# Altium footprint library D-SUB.PcbLib: 8 footprints
Each footprint in its own frame and in the unit in brackets; x right, y up, seen from the top. Pads: shape width x height; smd on the part's side, far side on the other; paste and mask are expansions set on the pad; w line width, h text height; cw(c..) or ccw(c..) is an arc to the next point about the centre after c.
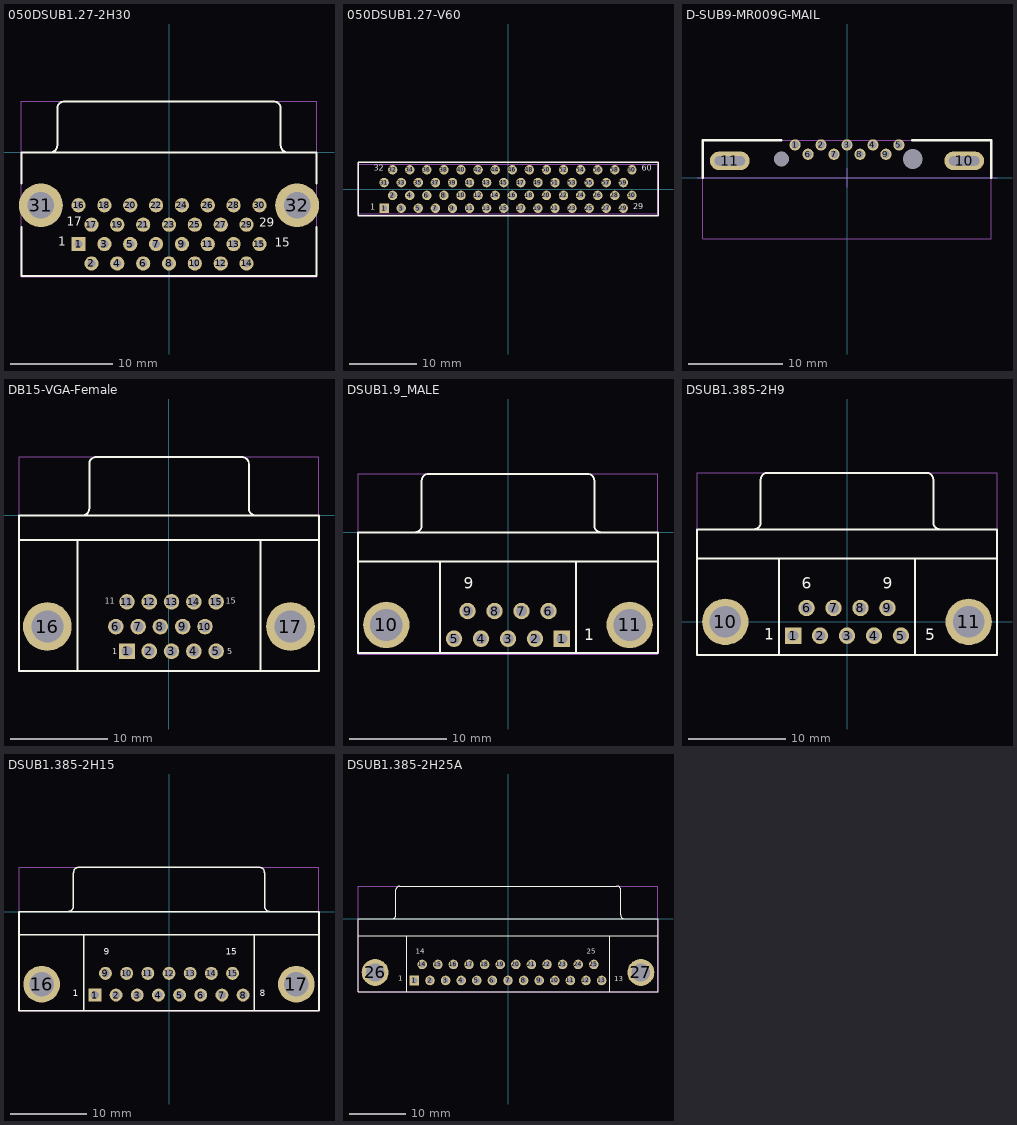
[diagram p0: the footprints below, top view; thin cyan lines are the x and y axes]

## 050DSUB1.27-2H30 [mm] "Connector; D Subminiature; 30 Position; Right Angle; Pitch 1.27 mm"
height 8.1
pads (32):
  rect 1.4x1.4 hole 0.8: 1(-8.89,-9.01)
  round 1.4 hole 0.8: 2(-7.62,-10.915) 3(-6.35,-9.01) 4(-5.08,-10.915) 5(-3.81,-9.01) 6(-2.54,-10.915) 7(-1.27,-9.01) 8(0,-10.915) 9(1.27,-9.01) 10(2.54,-10.915) 11(3.81,-9.01) 12(5.08,-10.915) 13(6.35,-9.01) 14(7.62,-10.915) 15(8.89,-9.01) 16(-8.89,-5.2) 17(-7.62,-7.105) 18(-6.35,-5.2) 19(-5.08,-7.105) 20(-3.81,-5.2) 21(-2.54,-7.105) 22(-1.27,-5.2) 23(0,-7.105) 24(1.27,-5.2) 25(2.54,-7.105) 26(3.81,-5.2) 27(5.08,-7.105) 28(6.35,-5.2) 29(7.62,-7.105) 30(8.89,-5.2)
  round 4.3 hole 2.6: 31(-12.59,-5.2) 32(12.59,-5.2)
Top Overlay:
  lines w0.2: -14.51,-7.341 -14.51,-12.17 14.51,-12.17 14.51,-7.341 ; -14.51,-3.043 -14.51,0 14.51,0 14.51,-3.043 ; -11.67,0 ccw(c-11.67,0.695) -10.975,0.695 ; -10.975,0.715 -10.975,4.305 cw(c-10.28,4.305) -10.28,5 10.28,5 cw(c10.28,4.305) 10.975,4.305 ; 10.975,4.495 10.975,0.695 ccw(c11.67,0.695) 11.67,0
  text "17" at -10.058,-7.513 h1.5
  text "29" at 8.865,-7.589 h1.5
  text "1" at -10.897,-9.494 h1.5
  text "15" at 10.389,-9.57 h1.5
Mechanical 13:
  lines w0.1: -14.51,-12.2 14.51,-12.2 14.51,5 -14.51,5 -14.51,-12.2
3D body: height 7.85, standoff -3.05, extent -14.51,-12.2 14.51,5

## 050DSUB1.27-V60 [mm] "Connector; D Subminiature; 60 Position; Vertical; Pitch 1.27 mm"
height 8
pads (60):
  rect 1.4x1.4 hole 0.8: 1(-18.415,-2.857)
  round 1.4 hole 0.8: 2(-17.145,-0.953) 3(-15.875,-2.857) 4(-14.605,-0.953) 5(-13.335,-2.857) 6(-12.065,-0.953) 7(-10.795,-2.857) 8(-9.525,-0.953) 9(-8.255,-2.857) 10(-6.985,-0.953) 11(-5.715,-2.857) 12(-4.445,-0.953) 13(-3.175,-2.857) 14(-1.905,-0.953) 15(-0.635,-2.857) 16(0.635,-0.953) 17(1.905,-2.857) 18(3.175,-0.953) 19(4.445,-2.857) 20(5.715,-0.953) 21(6.985,-2.857) 22(8.255,-0.953) 23(9.525,-2.857) 24(10.795,-0.953) 25(12.065,-2.857) 26(13.335,-0.953) 27(14.605,-2.857) 28(15.875,-0.953) 29(17.145,-2.857) 30(18.415,-0.953) 31(-18.415,0.953) 32(-17.145,2.857) 33(-15.875,0.953) 34(-14.605,2.857) 35(-13.335,0.953) 36(-12.065,2.857) 37(-10.795,0.953) 38(-9.525,2.857) 39(-8.255,0.953) 40(-6.985,2.857) 41(-5.715,0.953) 42(-4.445,2.857) 43(-3.175,0.953) 44(-1.905,2.857) 45(-0.635,0.953) 46(0.635,2.857) 47(1.905,0.953) 48(3.175,2.857) 49(4.445,0.953) 50(5.715,2.857) 51(6.985,0.953) 52(8.255,2.857) 53(9.525,0.953) 54(10.795,2.857) 55(12.065,0.953) 56(13.335,2.857) 57(14.605,0.953) 58(15.875,2.857) 59(17.145,0.953) 60(18.415,2.857)
Top Overlay:
  lines w0.2: -22.3,-4 -22.3,4 22.3,4 22.3,-4 -22.3,-4
  text "1" at -20.472,-3.353 h1.5
  text "29" at 18.593,-3.327 h1.5
  text "32" at -19.939,2.438 h1.5
  text "60" at 19.914,2.388 h1.5
Mechanical 13:
  lines w0.1: -22.3,-3.65 22.3,-3.65 22.3,3.65 -22.3,3.65 -22.3,-3.65
3D body: height 7.75, standoff -3.05, extent -22.3,-3.65 22.3,3.655

## D-SUB9-MR009G-MAIL [mm] "超薄D-SUB9 MAIL 针座"
height 11
pads (13):
  round 1.2 hole 0.8: 1(-5.54,3.5) 2(-2.77,3.5) 3(0,3.5) 4(2.77,3.5) 5(5.54,3.5) 6(-4.155,2.5) 7(-1.385,2.5) 8(1.385,2.5) 9(4.155,2.5)
  oval 4.25x2 hole 1 slot 3.25 at 0 deg: 10(12.5,1.8) 11(-12.5,1.8)
  round 1.55 hole 1.6: hole(-7,2)
  round 1.55 hole 2.1: hole(7,2)
Top Overlay:
  lines w0.25: -15.4,0 -15.4,4 -7,4 ; 6.97,4 15.4,4 15.4,0
Mechanical 1:
  lines w0.1: -16,0 16,0
Mechanical 13:
  lines w0.1: -15.4,-6.508 -15.4,4 15.4,4 15.4,-6.508 -15.4,-6.508
Mechanical 15:
  lines w0.1: -1,0 1,0 ; 0,-1 0,1
3D body: height 10.55, standoff -2.7, extent -15.4,-6.508 15.4,4

## DB15-VGA-Female [mm] "High density D sub 15 pin Female connector"
height 1
pads (17):
  rect 1.6x1.6 hole 1.1: 1(-4.31,-13.97)
  round 1.6 hole 1.1: 2(-2.02,-13.97) 3(0.27,-13.97) 4(2.56,-13.97) 5(4.85,-13.97) 6(-5.45,-11.43) 7(-3.16,-11.43) 8(-0.87,-11.43) 9(1.42,-11.43) 10(3.71,-11.43) 11(-4.31,-8.89) 12(-2.02,-8.89) 13(0.27,-8.89) 14(2.56,-8.89) 15(4.85,-8.89)
  round 5 hole 3.3: 16(-12.495,-11.43) 17(12.495,-11.43)
Top Overlay:
  lines w0.2: -15.41,-2.54 15.43,-2.54 ; -9.4,-16 -9.4,-2.54 ; -8.88,0.005 ccw(c-8.88,0.7) -8.185,0.7 -8.185,5.305 cw(c-7.49,5.305) -7.49,6 7.52,6 cw(c7.52,5.305) 8.215,5.305 ; 8.215,0.7 8.215,5.305 ; 8.215,0.7 ccw(c8.91,0.7) 8.91,0.005 ; 9.4,-16 9.4,-2.54 ; -15.41,-16 -15.41,0 15.43,0 15.43,-16 -15.41,-16
  text "11" at -6.596,-9.271 h1
  text "5" at 5.977,-14.478 h1
  text "15" at 5.85,-9.271 h1
  text "1" at -5.834,-14.478 h1
Mechanical 13:
  lines w0.05: -15.4,-16 15.4,-16 15.4,6 -15.4,6 -15.4,-16
3D body: height 12.55, standoff -3.45, extent -15.4,-16 15.4,6

## DSUB1.9_MALE [mm]
height 1
pads (11):
  rect 1.69x1.69 hole 1.1: 1(5.54,-10.92)
  round 1.69 hole 1.1: 2(2.77,-10.92) 3(0,-10.92) 4(-2.77,-10.92) 5(-5.54,-10.92) 6(4.155,-8.08) 7(1.385,-8.08) 8(-1.385,-8.08) 9(-4.155,-8.08)
  round 4.76 hole 3.3: 10(-12.495,-9.5) 11(12.495,-9.5)
Top Overlay:
  lines w0.2: -15.4,-3 15.4,-3 ; -9.56,0.005 ccw(c-9.56,0.7) -8.865,0.7 -8.865,5.305 ; -8.86,5.305 cw(c-8.165,5.305) -8.165,6 8.165,6 cw(c8.165,5.305) 8.86,5.305 ; -7,-12.4 -7,-3 ; 7,-12.4 7,-3 ; 8.865,5.305 8.865,0.7 ccw(c9.56,0.7) 9.56,0.005 ; -15.4,-12.4 -15.4,0 15.4,0 15.4,-12.4 -15.4,-12.4
  text "1" at 7.849,-11.481 h2
  text "9" at -4.554,-6.223 h2
Mechanical 13:
  lines w0.05: -15.4,-12.5 -15.4,6 15.4,6 15.4,-12.5 -15.4,-12.5
3D body: height 12.55, standoff -3.75, extent -15.4,-12.5 15.4,6

## DSUB1.385-2H9 [mm] "Connector; D Subminiature; 9 Position; Right Angle; Pitch 1.385 mm"
height 12.75
pads (11):
  rect 1.69x1.69 hole 1.09: 1(-5.54,-1.42)
  round 1.69 hole 1.09: 2(-2.77,-1.42) 3(0,-1.42) 4(2.77,-1.42) 5(5.54,-1.42) 6(-4.155,1.42) 7(-1.385,1.42) 8(1.385,1.42) 9(4.155,1.42)
  round 4.76 hole 3.26: 10(-12.495,0) 11(12.495,0)
Top Overlay:
  lines w0.2: -15.4,6.5 15.4,6.5 ; -9.56,9.505 ccw(c-9.56,10.2) -8.865,10.2 -8.865,14.605 ; -8.86,14.605 cw(c-8.165,14.605) -8.165,15.3 8.165,15.3 cw(c8.165,14.605) 8.86,14.605 ; -7,-3.429 -7,6.5 ; 7,-3.429 7,6.5 ; 8.865,14.605 8.865,10.2 ccw(c9.56,10.2) 9.56,9.505 ; -15.4,-3.429 15.4,-3.429 15.4,9.5 -15.4,9.5 -15.4,-3.429
  text "6" at -4.655,3.001 h2
  text "9" at 3.655,3.001 h2
  text "5" at 8.026,-2.286 h2
  text "1" at -8.484,-2.26 h2
Mechanical 13:
  lines w0.05: -15.4,-3.429 15.4,-3.429 15.4,15.281 -15.4,15.281 -15.4,-3.429
3D body: height 12.55, standoff -3.75, extent -15.4,-3.429 15.4,15.281

## DSUB1.385-2H15 [mm] "Connector; D Subminiature; 15 Position; Right Angle; Pitch 1.385 mm"
height 12.75
pads (17):
  rect 1.69x1.69 hole 1.09: 1(-9.695,-10.92)
  round 1.69 hole 1.09: 2(-6.925,-10.92) 3(-4.155,-10.92) 4(-1.385,-10.92) 5(1.385,-10.92) 6(4.155,-10.92) 7(6.925,-10.92) 8(9.695,-10.92) 9(-8.31,-8.08) 10(-5.54,-8.08) 11(-2.77,-8.08) 12(0,-8.08) 13(2.77,-8.08) 14(5.54,-8.08) 15(8.31,-8.08)
  round 4.8 hole 3.18: 16(-16.66,-9.5) 17(16.66,-9.5)
Top Overlay:
  lines w0.2: -19.625,-3 19.625,-3 ; -13.195,0.005 ccw(c-13.195,0.7) -12.5,0.7 -12.5,5.105 ; -12.495,5.105 cw(c-11.8,5.105) -11.8,5.8 11.8,5.8 cw(c11.8,5.105) 12.495,5.105 ; -11.14,-12.969 -11.14,-3 ; 11.14,-12.969 11.14,-3 ; 12.5,5.105 12.5,0.7 ccw(c13.195,0.7) 13.195,0.005 ; -19.625,-12.969 -19.625,0 19.625,0 19.625,-12.969 -19.625,-12.969
  text "1" at -12.598,-11.405 h1.5
  text "8" at 11.862,-11.405 h1.5
  text "15" at 7.439,-5.991 h1.5
  text "9" at -8.556,-5.991 h1.5
Mechanical 13:
  lines w0.05: -19.625,-12.969 19.625,-12.969 19.625,5.791 -19.625,5.791 -19.625,-12.969
3D body: height 12.55, standoff -3.75, extent -19.625,-12.969 19.625,5.791

## DSUB1.385-2H25A [mm] "Connector; D Subminiature; 25 Position; Right Angle; Pitch 1.385 mm"
height 12.93
pads (27):
  rect 1.69x1.69 hole 1.09: 1(-16.566,-10.92)
  round 1.69 hole 1.09: 2(-13.805,-10.92) 3(-11.044,-10.92) 4(-8.283,-10.92) 5(-5.522,-10.92) 6(-2.761,-10.92) 7(0,-10.92) 8(2.761,-10.92) 9(5.522,-10.92) 10(8.283,-10.92) 11(11.044,-10.92) 12(13.805,-10.92) 13(16.566,-10.92) 14(-15.185,-8.08) 15(-12.424,-8.08) 16(-9.663,-8.08) 17(-6.902,-8.08) 18(-4.141,-8.08) 19(-1.38,-8.08) 20(1.381,-8.08) 21(4.142,-8.08) 22(6.903,-8.08) 23(9.664,-8.08) 24(12.425,-8.08) 25(15.186,-8.08)
  round 4.76 hole 3.26: 26(-23.526,-9.5) 27(23.526,-9.5)
Top Overlay:
  lines w0.2: -26.55,-3 26.55,-3 ; -20.541,0.005 ccw(c-20.541,0.7) -19.846,0.7 -19.846,5.105 ; -19.841,5.105 cw(c-19.146,5.105) -19.146,5.8 19.254,5.8 cw(c19.254,5.105) 19.949,5.105 ; -17.946,-12.955 -17.946,-3 ; 18.054,-12.955 18.054,-3 ; 19.954,5.105 19.954,0.7 ccw(c20.649,0.7) 20.649,0.005 ; -26.55,-12.955 26.55,-12.955 26.55,0 -26.55,0 -26.55,-12.955
  text "1" at -19.431,-11.303 h1.5
  text "13" at 18.821,-11.43 h1.5
  text "14" at -16.31,-6.499 h1.5
  text "25" at 13.936,-6.499 h1.5
Mechanical 13:
  lines w0.05: -26.55,-12.955 -26.55,5.8 26.55,5.8 26.55,-12.955 -26.55,-12.955
3D body: height 12.55, standoff -3.75, extent -26.55,-12.955 26.55,5.8